# Altium footprint library lib_protel_HC.PCBLIB: 724 footprints (part 17 of 46)
Each footprint in its own frame and in the unit in brackets; x right, y up, seen from the top. Pads: shape width x height; smd on the part's side, far side on the other; paste and mask are expansions set on the pad; w line width, h text height; cw(c..) or ccw(c..) is an arc to the next point about the centre after c.
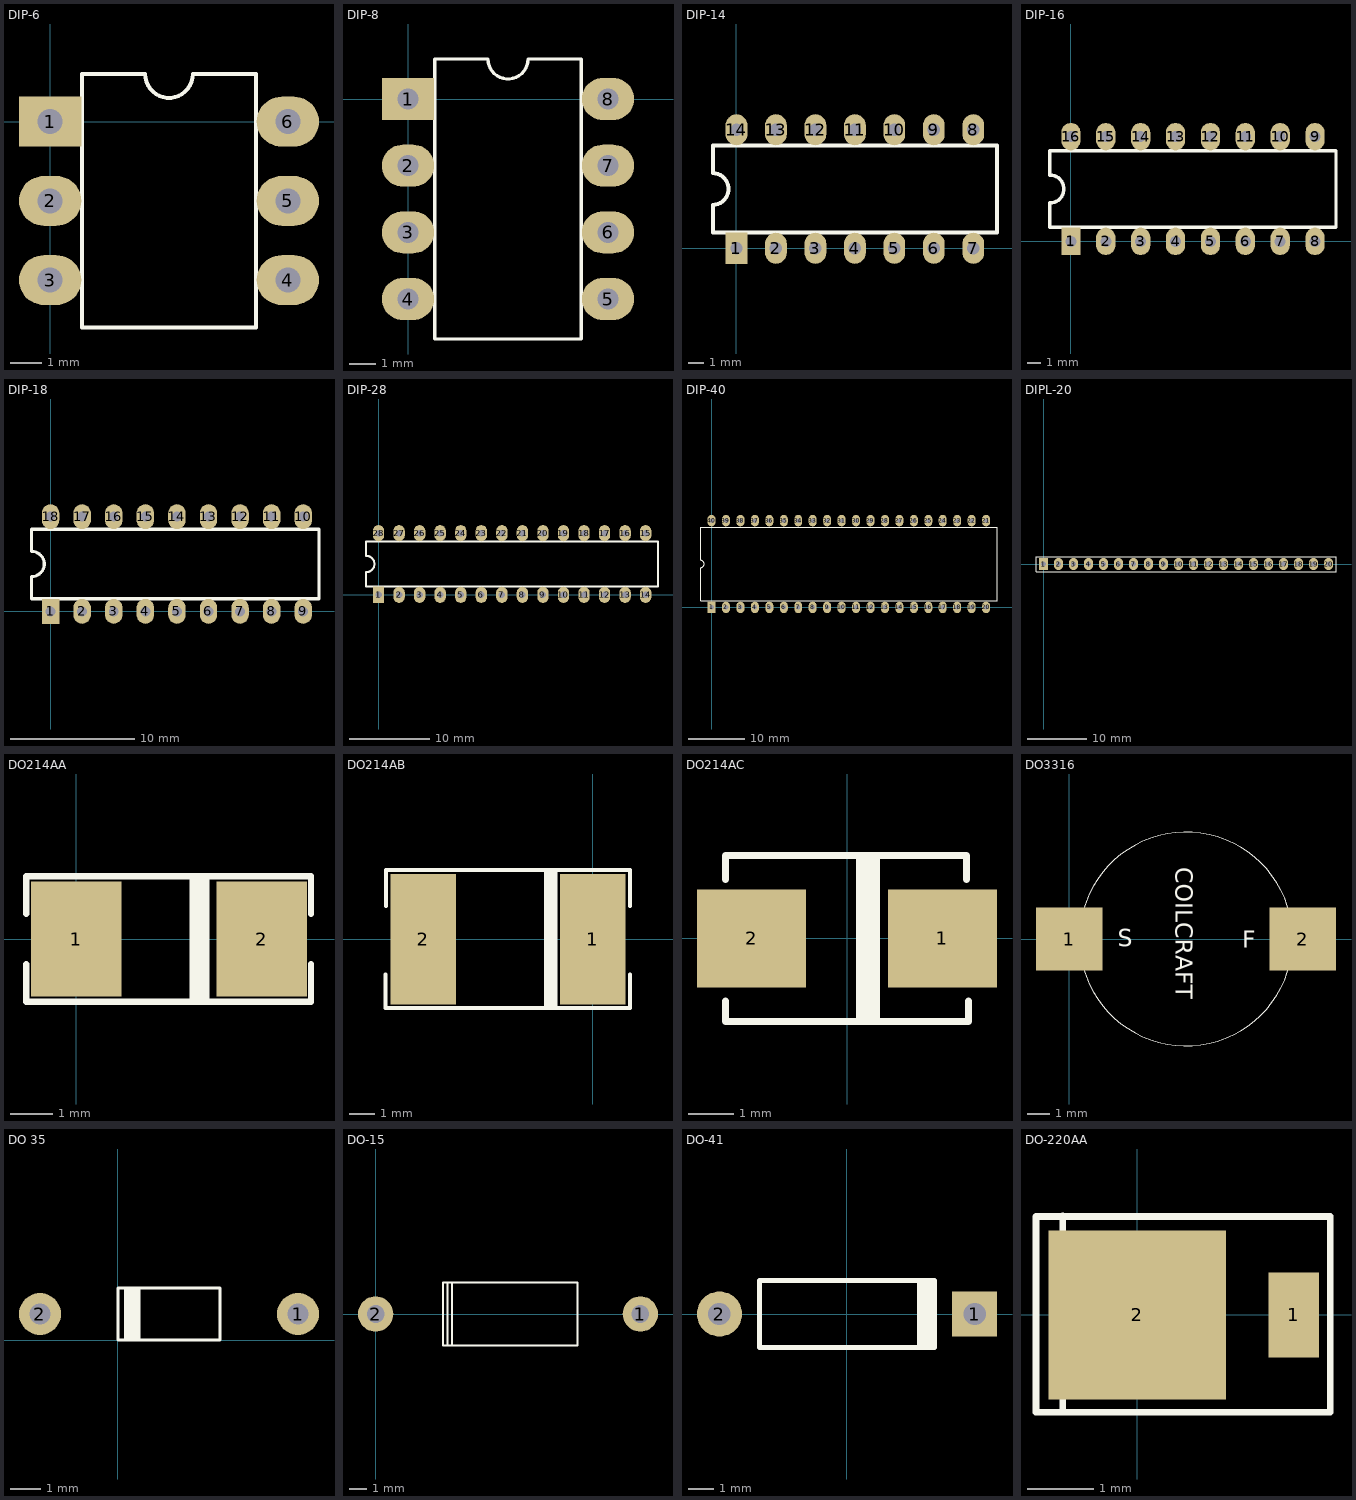
[diagram p16: the footprints below, top view; thin cyan lines are the x and y axes]

## DIP-6 [mm]
pads (6):
  rect 2x1.6 hole 0.8: 1(0,0)
  oval 2x1.6 hole 0.8: 2(0,-2.54) 3(0,-5.08) 4(7.62,-5.08) 5(7.62,-2.54) 6(7.62,0)
Top Overlay:
  lines w0.127: 1.016,-6.604 1.016,1.524 3.048,1.524 ccw(c3.81,1.524) 4.572,1.524 6.604,1.524 6.604,-6.604 1.016,-6.604

## DIP-8 [mm] "DIP-8"
pads (8):
  rect 2x1.6 hole 0.8: 1(0,0)
  oval 2x1.6 hole 0.8: 2(0,-2.54) 3(0,-5.08) 4(0,-7.62) 5(7.62,-7.62) 6(7.62,-5.08) 7(7.62,-2.54) 8(7.62,0)
Top Overlay:
  lines w0.127: 1.016,-9.144 6.604,-9.144 6.604,-6.604 6.604,1.524 4.572,1.524 cw(c3.81,1.524) 3.048,1.524 1.016,1.524 1.016,-6.604 1.016,-9.144

## DIP-14 [mm]
pads (14):
  rect 1.4x2 hole 0.8: 1(0,0)
  oval 1.4x2 hole 0.8: 2(2.54,0) 3(5.08,0) 4(7.62,0) 5(10.16,0) 6(12.7,0) 7(15.24,0) 8(15.24,7.62) 9(12.7,7.62) 10(10.16,7.62) 11(7.62,7.62) 12(5.08,7.62) 13(2.54,7.62) 14(0,7.62)
Top Overlay:
  lines w0.254: -1.524,1.016 16.764,1.016 16.764,6.604 -1.524,6.604 -1.524,4.826 cw(c-1.524,3.81) -1.524,2.794 -1.524,1.016

## DIP-16 [mm] "DIP-16"
pads (16):
  rect 1.4x2 hole 0.8: 1(0,0)
  oval 1.4x2 hole 0.8: 2(2.54,0) 3(5.08,0) 4(7.62,0) 5(10.16,0) 6(12.7,0) 7(15.24,0) 8(17.78,0) 9(17.78,7.62) 10(15.24,7.62) 11(12.7,7.62) 12(10.16,7.62) 13(7.62,7.62) 14(5.08,7.62) 15(2.54,7.62) 16(0,7.62)
Top Overlay:
  lines w0.254: -1.524,1.016 19.304,1.016 19.304,6.604 -1.524,6.604 -1.524,4.826 cw(c-1.524,3.81) -1.524,2.794 -1.524,1.016

## DIP-18 [mm]
pads (18):
  rect 1.4x2 hole 0.8: 1(0,0)
  oval 1.4x2 hole 0.8: 2(2.54,0) 3(5.08,0) 4(7.62,0) 5(10.16,0) 6(12.7,0) 7(15.24,0) 8(17.78,0) 9(20.32,0) 10(20.32,7.62) 11(17.78,7.62) 12(15.24,7.62) 13(12.7,7.62) 14(10.16,7.62) 15(7.62,7.62) 16(5.08,7.62) 17(2.54,7.62) 18(0,7.62)
Top Overlay:
  lines w0.254: -1.524,1.016 -1.524,2.794 ccw(c-1.524,3.81) -1.524,4.826 -1.524,6.604 21.59,6.604 21.59,1.016 -1.524,1.016

## DIP-28 [mm]
pads (28):
  rect 1.4x2 hole 0.8: 1(0,0)
  oval 1.4x2 hole 0.8: 2(2.54,0) 3(5.08,0) 4(7.62,0) 5(10.16,0) 6(12.7,0) 7(15.24,0) 8(17.78,0) 9(20.32,0) 10(22.86,0) 11(25.4,0) 12(27.94,0) 13(30.48,0) 14(33.02,0) 15(33.02,7.62) 16(30.48,7.62) 17(27.94,7.62) 18(25.4,7.62) 19(22.86,7.62) 20(20.32,7.62) 21(17.78,7.62) 22(15.24,7.62) 23(12.7,7.62) 24(10.16,7.62) 25(7.62,7.62) 26(5.08,7.62) 27(2.54,7.62) 28(0,7.62)
Top Overlay:
  lines w0.254: -1.524,1.016 -1.524,2.794 ccw(c-1.524,3.81) -1.524,4.826 -1.524,6.604 34.544,6.604 34.544,1.016 -1.524,1.016

## DIP-40 [mm]
pads (40):
  rect 1.4x2 hole 0.8: 1(0,0)
  oval 1.4x2 hole 0.8: 2(2.54,0) 3(5.08,0) 4(7.62,0) 5(10.16,0) 6(12.7,0) 7(15.24,0) 8(17.78,0) 9(20.32,0) 10(22.86,0) 11(25.4,0) 12(27.94,0) 13(30.48,0) 14(33.02,0) 15(35.56,0) 16(38.1,0) 17(40.64,0) 18(43.18,0) 19(45.72,0) 20(48.26,0) 21(48.26,15.24) 22(45.72,15.24) 23(43.18,15.24) 24(40.64,15.24) 25(38.1,15.24) 26(35.56,15.24) 27(33.02,15.24) 28(30.48,15.24) 29(27.94,15.24) 30(25.4,15.24) 31(22.86,15.24) 32(20.32,15.24) 33(17.78,15.24) 34(15.24,15.24) 35(12.7,15.24) 36(10.16,15.24) 37(7.62,15.24) 38(5.08,15.24) 39(2.54,15.24) 40(0,15.24)
Top Overlay:
  lines w0.2: -1.92,1.17 50.18,1.17 50.18,14.07 -1.92,14.07 -1.92,8.255 cw(c-1.92,7.62) -1.92,6.985 -1.92,1.17

## DIPL-20 [mm] "BARRA 20 PINES EN DIP(100mils)"
pads (20):
  rect 1.6x2 hole 0.8: 1(0,0)
  oval 1.6x2 hole 0.8: 2(2.54,0) 3(5.08,0) 4(7.62,0) 5(10.16,0) 6(12.7,0) 7(15.24,0) 8(17.78,0) 9(20.32,0) 10(22.86,0) 11(25.4,0) 12(27.94,0) 13(30.48,0) 14(33.02,0) 15(35.56,0) 16(38.1,0) 17(40.64,0) 18(43.18,0) 19(45.72,0) 20(48.26,0)
Top Overlay:
  lines w0.2: -1.27,-1.27 -1.27,1.27 21.59,1.27 49.53,1.27 49.53,-1.27 21.59,-1.27 -1.27,-1.27

## DO214AA [mil] "DIODE"
height 102.99
pads (2):
  rect 85x107.99 smd paste+0 mask+3: 1(0,0) 2(174.02,0)
Top Overlay:
  rectangle: 106.3,-59.06 125.12,59.06
  lines w6: -47.24,-23.62 -47.24,-59.06 220.47,-59.06 220.47,-23.62 ; -47.24,23.62 -47.24,59.06 220.47,59.06 220.47,23.62

## DO214AB [mil] "DIODE"
height 102.99
pads (2):
  rect 100x200 smd paste+0 mask+3: 1(0,0) 2(-260,0)
Top Overlay:
  rectangle: -74.93,-104 -54.14,104
  lines w6: -318,-54.13 -318,-105 57,-105 57,-54.13 ; -317,51.18 -317,106 57,106 57,51.18

## DO214AC [mm]
height 2.616
pads (2):
  rect 2.4x2.159 smd paste+0 mask+0.076: 1(2.1,0) 2(-2.1,0)
Top Overlay:
  rectangle: 0.197,-1.85 0.725,1.825
  lines w0.152: -2.675,-1.375 -2.675,-1.825 2.675,-1.825 2.675,-1.375 ; -2.675,1.3 -2.675,1.825 2.625,1.825 2.625,1.3

## DO3316 [mm] "INDUCTOR DO3316"
height 5.21
pads (2):
  rect 2.92x2.79 smd mask+0: 1(0,0) 2(10.29,0)
Top Overlay:
  circle w0.051: c5.15,0 r4.7
  text "F" at 7.62,-0.38 h0.76
  text "S" at 2.15,-0.33 h0.76
  text "COILCRAFT" at 4.69,3.15 h0.76

## DO 35 [mm]
height 1.75
pads (2):
  round 1.4 hole 0.7: 1(6,0.875) 2(-2.6,0.875)
Top Overlay:
  rectangle: 0.246,0 0.712,1.75
  lines w0.1: 0.246,0 0.246,1.75 ; 0.704,0 0.704,1.75 ; 0,0 0,1.75 3.4,1.75 3.4,0 0,0

## DO-15 [mm] "DO-15, PARA ZENER, ETC.."
height 3.5
pads (2):
  round 2 hole 1: 1(14.986,0) 2(0,0)
Top Overlay:
  lines w0.127: 4.064,-1.778 4.064,1.778 ; 4.318,-1.778 4.318,1.778 ; 3.81,-1.778 11.43,-1.778 11.43,1.778 3.81,1.778 3.81,-1.778

## DO-41 [mm]
pads (2):
  rect 1.8x1.8 hole 0.9: 1(5.105,0)
  round 1.8 hole 0.9: 2(-5.1,0)
Top Overlay:
  rectangle: 2.8,-1.35 3.6,1.35
  lines w0.2: 3.5,-1.35 -3.5,-1.35 -3.5,1.35 3.5,1.35

## DO-220AA [mil] "DIODO SCHOTTKY"
height 40
pads (2):
  rect 30x50 smd mask+3.94: 1(92.52,0)
  rect 105x100 smd mask+3.94: 2(0,0)
Top Overlay:
  lines w3.94: -44.09,-57.48 -44.09,58.66
  lines w4: -59.84,-57.48 114.17,-57.48 114.17,58.27 -59.84,58.27 -59.84,-57.48